# Altium integrated library Lattice CPLD ispLSI.IntLib: 471 symbols (part 3 of 26) (continued)
## ispLSI1048E-50LQI (continued)

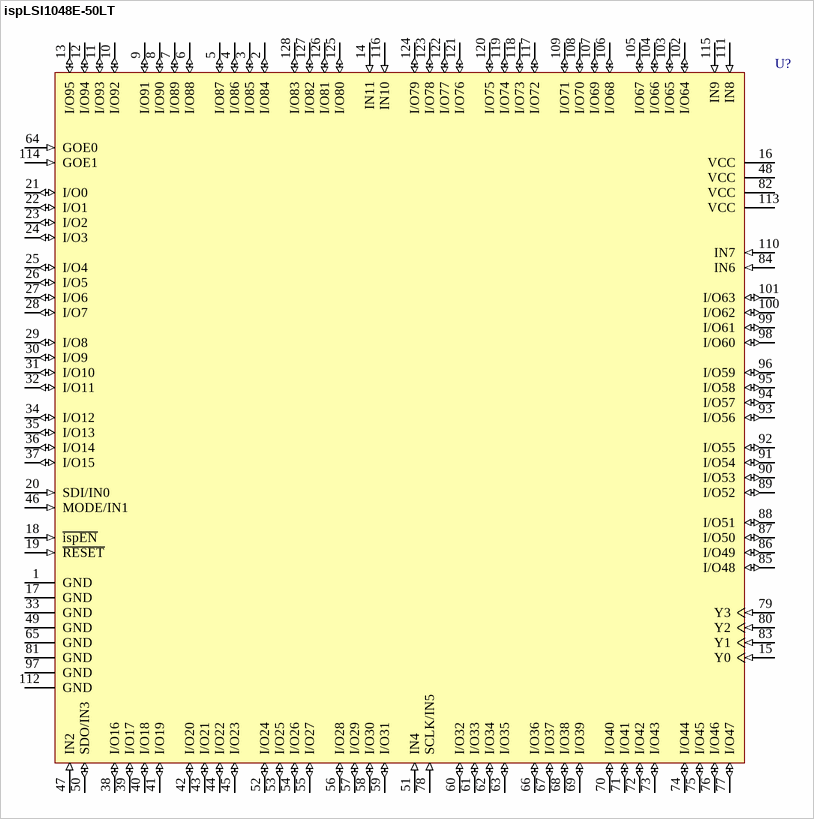
[diagram p19: symbol ispLSI1048E-50LT]

## ispLSI1048E-50LT
designator U?
In-System Programmable High-Density PLD; Note: Pins 20, 46, 50 and 78 have dual function capability.; Published: 23-Sep-2002; LatestRevisionDate: 13-Apr-2006; LatestRevisionNote: IPC-7351 Footprint Added.; DatasheetVersion: Oct-1998; PackageVersion: Aug-2005; PackageReference: TQFP128; Publisher: Altium Limited; PackageDescription: 128-Pin Thin Quad Flat Pack 0.4 mm Pitch; ComponentLink1Description: Manufacturer Link; ComponentLink1URL: http://www.latticesemi.com/products/mature/index.cfm; ComponentLink2Description: Datasheet; ComponentLink2URL: http://www.latticesemi.com/lit/docs/datasheets/cpld/1048e.pdf
footprint TQFP128_N (Thin QFP, 128-Leads, Body 14x14mm, Pitch 0.4mm, IPC Medium Density)
footprint TQFP128_L (Thin QFP, 128-Leads, Body 14x14mm, Pitch 0.4mm, IPC High Density)
footprint TQFP128_M (Thin QFP, 128-Leads, Body 14x14mm, Pitch 0.4mm, IPC Low Density)
3D model 1048E-TQFP128 (128-Pin Thin Quad Flat Pack 0.4 mm Pitch)
pins: 1 GND (power), 2 I/O84 (io), 3 I/O85 (io), 4 I/O86 (io), 5 I/O87 (io), 6 I/O88 (io), 7 I/O89 (io), 8 I/O90 (io), 9 I/O91 (io), 10 I/O92 (io), 11 I/O93 (io), 12 I/O94 (io), 13 I/O95 (io), 14 IN11 (in), 15 Y0 (in), 16 VCC (power), 17 GND (power), 18 ~{ispEN} (in), 19 ~{RESET} (in), 20 SDI/IN0 (in), 21 I/O0 (io), 22 I/O1 (io), 23 I/O2 (io), 24 I/O3 (io), 25 I/O4 (io), 26 I/O5 (io), 27 I/O6 (io), 28 I/O7 (io), 29 I/O8 (io), 30 I/O9 (io), 31 I/O10 (io), 32 I/O11 (io), 33 GND (power), 34 I/O12 (io), 35 I/O13 (io), 36 I/O14 (io), 37 I/O15 (io), 38 I/O16 (io), 39 I/O17 (io), 40 I/O18 (io), 41 I/O19 (io), 42 I/O20 (io), 43 I/O21 (io), 44 I/O22 (io), 45 I/O23 (io), 46 MODE/IN1 (in), 47 IN2 (in), 48 VCC (power), 49 GND (power), 50 SDO/IN3 (io), 51 IN4 (in), 52 I/O24 (io), 53 I/O25 (io), 54 I/O26 (io), 55 I/O27 (io), 56 I/O28 (io), 57 I/O29 (io), 58 I/O30 (io), 59 I/O31 (io), 60 I/O32 (io), 61 I/O33 (io), 62 I/O34 (io), 63 I/O35 (io), 64 GOE0 (in), 65 GND (power), 66 I/O36 (io), 67 I/O37 (io), 68 I/O38 (io), 69 I/O39 (io), 70 I/O40 (io), 71 I/O41 (io), 72 I/O42 (io), 73 I/O43 (io), 74 I/O44 (io), 75 I/O45 (io), 76 I/O46 (io), 77 I/O47 (io), 78 SCLK/IN5 (in), 79 Y3 (in), 80 Y2 (in), 81 GND (power), 82 VCC (power), 83 Y1 (in), 84 IN6 (in), 85 I/O48 (io), 86 I/O49 (io), 87 I/O50 (io), 88 I/O51 (io), 89 I/O52 (io), 90 I/O53 (io), 91 I/O54 (io), 92 I/O55 (io), 93 I/O56 (io), 94 I/O57 (io), 95 I/O58 (io), 96 I/O59 (io), 97 GND (power), 98 I/O60 (io), 99 I/O61 (io), 100 I/O62 (io), 101 I/O63 (io), 102 I/O64 (io), 103 I/O65 (io), 104 I/O66 (io), 105 I/O67 (io), 106 I/O68 (io), 107 I/O69 (io), 108 I/O70 (io), 109 I/O71 (io), 110 IN7 (in), 111 IN8 (in), 112 GND (power), 113 VCC (power), 114 GOE1 (in), 115 IN9 (in), 116 IN10 (in), 117 I/O72 (io), 118 I/O73 (io), 119 I/O74 (io), 120 I/O75 (io), 121 I/O76 (io), 122 I/O77 (io), 123 I/O78 (io), 124 I/O79 (io), 125 I/O80 (io), 126 I/O81 (io), 127 I/O82 (io), 128 I/O83 (io)

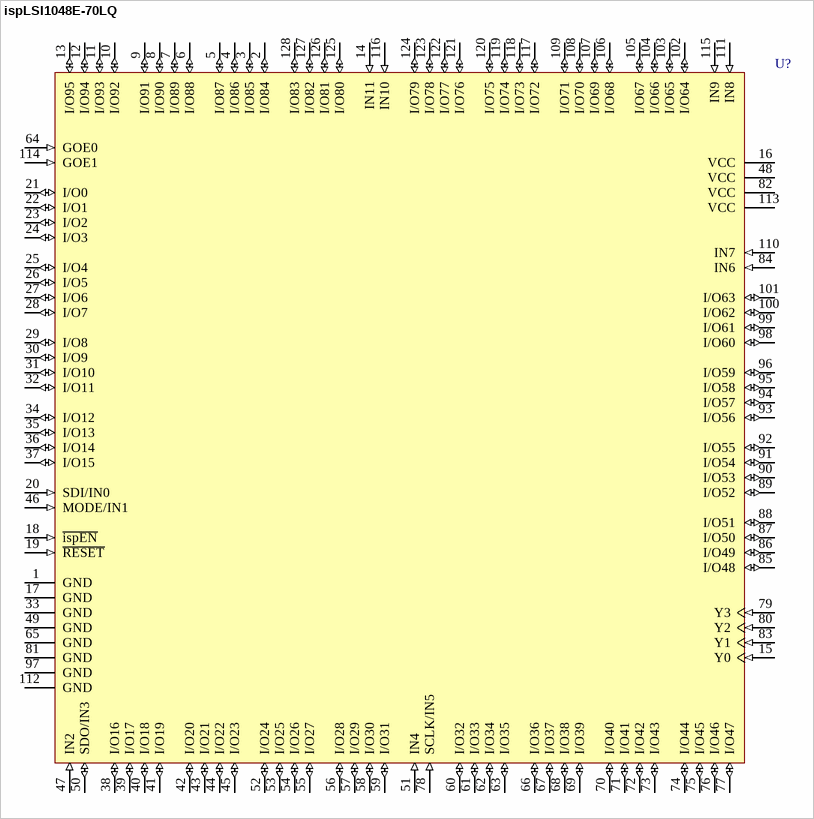
[diagram p20: symbol ispLSI1048E-70LQ]

## ispLSI1048E-70LQ
designator U?
In-System Programmable High-Density PLD; Note: Pins 20, 46, 50 and 78 have dual function capability.; Published: 23-Sep-2002; LatestRevisionDate: 13-Apr-2006; LatestRevisionNote: IPC-7351 Footprint Added.; DatasheetVersion: Oct-1998; PackageVersion: pkg_32, Aug-2005; PackageReference: PQFP128; Publisher: Altium Limited; PackageDescription: 128-Pin Quad Flat Pack 0.8 mm Pitch; Code_IPC: QFP80P3120X3120-128; ComponentLink1Description: Manufacturer Link; ComponentLink1URL: http://www.latticesemi.com/products/mature/index.cfm; ComponentLink2Description: Datasheet; ComponentLink2URL: http://www.latticesemi.com/lit/docs/datasheets/cpld/1048e.pdf
footprint PQFP128_N (QFP, 128-Leads, Body 28x28mm, Pitch 0.8mm, IPC Medium Density)
footprint PQFP128_L (QFP, 128-Leads, Body 28x28mm, Pitch 0.8mm, IPC High Density)
footprint PQFP128_M (QFP, 128-Leads, Body 28x28mm, Pitch 0.8mm, IPC Low Density)
3D model 1048E-PQFP128 (128-Pin Quad Flat Pack 0.8 mm Pitch)
pins: 1 GND (power), 2 I/O84 (io), 3 I/O85 (io), 4 I/O86 (io), 5 I/O87 (io), 6 I/O88 (io), 7 I/O89 (io), 8 I/O90 (io), 9 I/O91 (io), 10 I/O92 (io), 11 I/O93 (io), 12 I/O94 (io), 13 I/O95 (io), 14 IN11 (in), 15 Y0 (in), 16 VCC (power), 17 GND (power), 18 ~{ispEN} (in), 19 ~{RESET} (in), 20 SDI/IN0 (in), 21 I/O0 (io), 22 I/O1 (io), 23 I/O2 (io), 24 I/O3 (io), 25 I/O4 (io), 26 I/O5 (io), 27 I/O6 (io), 28 I/O7 (io), 29 I/O8 (io), 30 I/O9 (io), 31 I/O10 (io), 32 I/O11 (io), 33 GND (power), 34 I/O12 (io), 35 I/O13 (io), 36 I/O14 (io), 37 I/O15 (io), 38 I/O16 (io), 39 I/O17 (io), 40 I/O18 (io), 41 I/O19 (io), 42 I/O20 (io), 43 I/O21 (io), 44 I/O22 (io), 45 I/O23 (io), 46 MODE/IN1 (in), 47 IN2 (in), 48 VCC (power), 49 GND (power), 50 SDO/IN3 (io), 51 IN4 (in), 52 I/O24 (io), 53 I/O25 (io), 54 I/O26 (io), 55 I/O27 (io), 56 I/O28 (io), 57 I/O29 (io), 58 I/O30 (io), 59 I/O31 (io), 60 I/O32 (io), 61 I/O33 (io), 62 I/O34 (io), 63 I/O35 (io), 64 GOE0 (in), 65 GND (power), 66 I/O36 (io), 67 I/O37 (io), 68 I/O38 (io), 69 I/O39 (io), 70 I/O40 (io), 71 I/O41 (io), 72 I/O42 (io), 73 I/O43 (io), 74 I/O44 (io), 75 I/O45 (io), 76 I/O46 (io), 77 I/O47 (io), 78 SCLK/IN5 (in), 79 Y3 (in), 80 Y2 (in), 81 GND (power), 82 VCC (power), 83 Y1 (in), 84 IN6 (in), 85 I/O48 (io), 86 I/O49 (io), 87 I/O50 (io), 88 I/O51 (io), 89 I/O52 (io), 90 I/O53 (io), 91 I/O54 (io), 92 I/O55 (io), 93 I/O56 (io), 94 I/O57 (io), 95 I/O58 (io), 96 I/O59 (io), 97 GND (power), 98 I/O60 (io), 99 I/O61 (io), 100 I/O62 (io), 101 I/O63 (io), 102 I/O64 (io), 103 I/O65 (io), 104 I/O66 (io), 105 I/O67 (io), 106 I/O68 (io), 107 I/O69 (io), 108 I/O70 (io), 109 I/O71 (io), 110 IN7 (in), 111 IN8 (in), 112 GND (power), 113 VCC (power), 114 GOE1 (in), 115 IN9 (in), 116 IN10 (in), 117 I/O72 (io), 118 I/O73 (io), 119 I/O74 (io), 120 I/O75 (io), 121 I/O76 (io), 122 I/O77 (io), 123 I/O78 (io), 124 I/O79 (io), 125 I/O80 (io), 126 I/O81 (io), 127 I/O82 (io), 128 I/O83 (io)

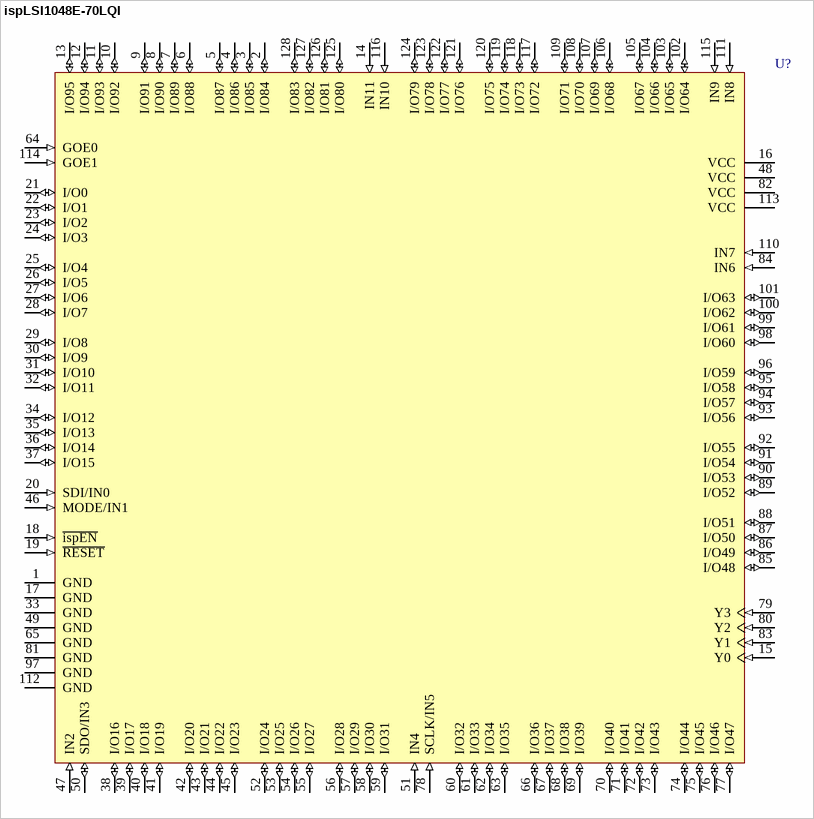
[diagram p21: symbol ispLSI1048E-70LQI]

## ispLSI1048E-70LQI
designator U?
In-System Programmable High-Density PLD; Note: Pins 20, 46, 50 and 78 have dual function capability.; Published: 23-Sep-2002; LatestRevisionDate: 13-Apr-2006; LatestRevisionNote: IPC-7351 Footprint Added.; DatasheetVersion: Oct-1998; PackageVersion: pkg_32, Aug-2005; PackageReference: PQFP128; Publisher: Altium Limited; PackageDescription: 128-Pin Quad Flat Pack 0.8 mm Pitch; Code_IPC: QFP80P3120X3120-128; ComponentLink1Description: Manufacturer Link; ComponentLink1URL: http://www.latticesemi.com/products/mature/index.cfm; ComponentLink2Description: Datasheet; ComponentLink2URL: http://www.latticesemi.com/lit/docs/datasheets/cpld/1048e.pdf
footprint PQFP128_N (QFP, 128-Leads, Body 28x28mm, Pitch 0.8mm, IPC Medium Density)
footprint PQFP128_L (QFP, 128-Leads, Body 28x28mm, Pitch 0.8mm, IPC High Density)
footprint PQFP128_M (QFP, 128-Leads, Body 28x28mm, Pitch 0.8mm, IPC Low Density)
3D model 1048E-PQFP128 (128-Pin Quad Flat Pack 0.8 mm Pitch)
pins: 1 GND (power), 2 I/O84 (io), 3 I/O85 (io), 4 I/O86 (io), 5 I/O87 (io), 6 I/O88 (io), 7 I/O89 (io), 8 I/O90 (io), 9 I/O91 (io), 10 I/O92 (io), 11 I/O93 (io), 12 I/O94 (io), 13 I/O95 (io), 14 IN11 (in), 15 Y0 (in), 16 VCC (power), 17 GND (power), 18 ~{ispEN} (in), 19 ~{RESET} (in), 20 SDI/IN0 (in), 21 I/O0 (io), 22 I/O1 (io), 23 I/O2 (io), 24 I/O3 (io), 25 I/O4 (io), 26 I/O5 (io), 27 I/O6 (io), 28 I/O7 (io), 29 I/O8 (io), 30 I/O9 (io), 31 I/O10 (io), 32 I/O11 (io), 33 GND (power), 34 I/O12 (io), 35 I/O13 (io), 36 I/O14 (io), 37 I/O15 (io), 38 I/O16 (io), 39 I/O17 (io), 40 I/O18 (io), 41 I/O19 (io), 42 I/O20 (io), 43 I/O21 (io), 44 I/O22 (io), 45 I/O23 (io), 46 MODE/IN1 (in), 47 IN2 (in), 48 VCC (power), 49 GND (power), 50 SDO/IN3 (io), 51 IN4 (in), 52 I/O24 (io), 53 I/O25 (io), 54 I/O26 (io), 55 I/O27 (io), 56 I/O28 (io), 57 I/O29 (io), 58 I/O30 (io), 59 I/O31 (io), 60 I/O32 (io), 61 I/O33 (io), 62 I/O34 (io), 63 I/O35 (io), 64 GOE0 (in), 65 GND (power), 66 I/O36 (io), 67 I/O37 (io), 68 I/O38 (io), 69 I/O39 (io), 70 I/O40 (io), 71 I/O41 (io), 72 I/O42 (io), 73 I/O43 (io), 74 I/O44 (io), 75 I/O45 (io), 76 I/O46 (io), 77 I/O47 (io), 78 SCLK/IN5 (in), 79 Y3 (in), 80 Y2 (in), 81 GND (power), 82 VCC (power), 83 Y1 (in), 84 IN6 (in), 85 I/O48 (io), 86 I/O49 (io), 87 I/O50 (io), 88 I/O51 (io), 89 I/O52 (io), 90 I/O53 (io), 91 I/O54 (io), 92 I/O55 (io), 93 I/O56 (io), 94 I/O57 (io), 95 I/O58 (io), 96 I/O59 (io), 97 GND (power), 98 I/O60 (io), 99 I/O61 (io), 100 I/O62 (io), 101 I/O63 (io), 102 I/O64 (io), 103 I/O65 (io), 104 I/O66 (io), 105 I/O67 (io), 106 I/O68 (io), 107 I/O69 (io), 108 I/O70 (io), 109 I/O71 (io), 110 IN7 (in), 111 IN8 (in), 112 GND (power), 113 VCC (power), 114 GOE1 (in), 115 IN9 (in), 116 IN10 (in), 117 I/O72 (io), 118 I/O73 (io), 119 I/O74 (io), 120 I/O75 (io), 121 I/O76 (io), 122 I/O77 (io), 123 I/O78 (io), 124 I/O79 (io), 125 I/O80 (io), 126 I/O81 (io), 127 I/O82 (io), 128 I/O83 (io)

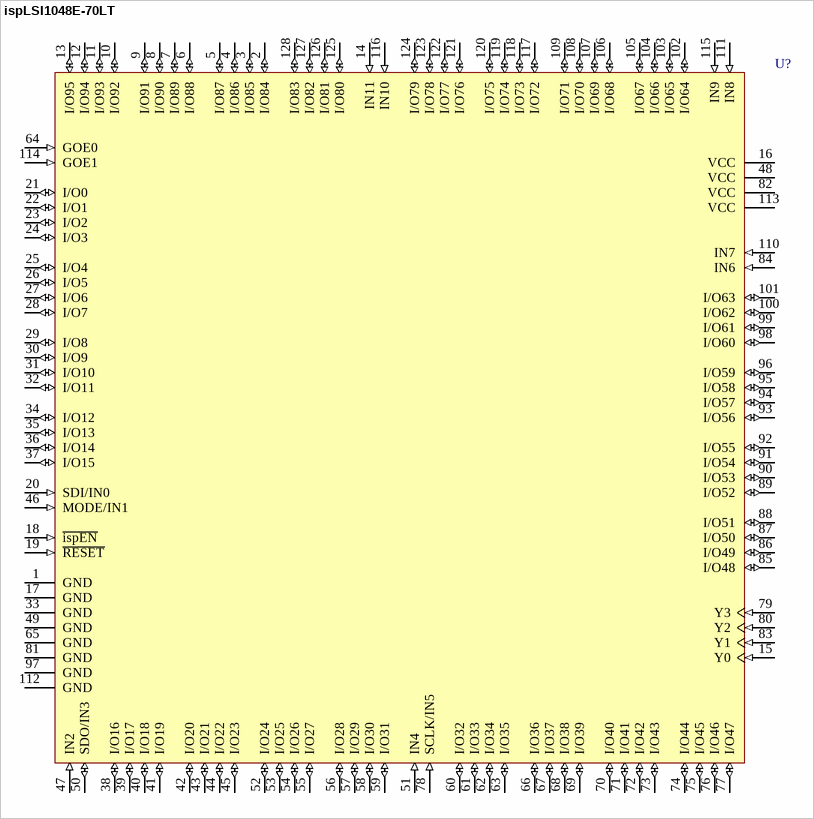
[diagram p22: symbol ispLSI1048E-70LT]

## ispLSI1048E-70LT
designator U?
In-System Programmable High-Density PLD; Note: Pins 20, 46, 50 and 78 have dual function capability.; Published: 23-Sep-2002; LatestRevisionDate: 13-Apr-2006; LatestRevisionNote: IPC-7351 Footprint Added.; DatasheetVersion: Oct-1998; PackageVersion: Aug-2005; PackageReference: TQFP128; Publisher: Altium Limited; PackageDescription: 128-Pin Thin Quad Flat Pack 0.4 mm Pitch; ComponentLink1Description: Manufacturer Link; ComponentLink1URL: http://www.latticesemi.com/products/mature/index.cfm; ComponentLink2Description: Datasheet; ComponentLink2URL: http://www.latticesemi.com/lit/docs/datasheets/cpld/1048e.pdf
footprint TQFP128_N (Thin QFP, 128-Leads, Body 14x14mm, Pitch 0.4mm, IPC Medium Density)
footprint TQFP128_L (Thin QFP, 128-Leads, Body 14x14mm, Pitch 0.4mm, IPC High Density)
footprint TQFP128_M (Thin QFP, 128-Leads, Body 14x14mm, Pitch 0.4mm, IPC Low Density)
3D model 1048E-TQFP128 (128-Pin Thin Quad Flat Pack 0.4 mm Pitch)
pins: 1 GND (power), 2 I/O84 (io), 3 I/O85 (io), 4 I/O86 (io), 5 I/O87 (io), 6 I/O88 (io), 7 I/O89 (io), 8 I/O90 (io), 9 I/O91 (io), 10 I/O92 (io), 11 I/O93 (io), 12 I/O94 (io), 13 I/O95 (io), 14 IN11 (in), 15 Y0 (in), 16 VCC (power), 17 GND (power), 18 ~{ispEN} (in), 19 ~{RESET} (in), 20 SDI/IN0 (in), 21 I/O0 (io), 22 I/O1 (io), 23 I/O2 (io), 24 I/O3 (io), 25 I/O4 (io), 26 I/O5 (io), 27 I/O6 (io), 28 I/O7 (io), 29 I/O8 (io), 30 I/O9 (io), 31 I/O10 (io), 32 I/O11 (io), 33 GND (power), 34 I/O12 (io), 35 I/O13 (io), 36 I/O14 (io), 37 I/O15 (io), 38 I/O16 (io), 39 I/O17 (io), 40 I/O18 (io), 41 I/O19 (io), 42 I/O20 (io), 43 I/O21 (io), 44 I/O22 (io), 45 I/O23 (io), 46 MODE/IN1 (in), 47 IN2 (in), 48 VCC (power), 49 GND (power), 50 SDO/IN3 (io), 51 IN4 (in), 52 I/O24 (io), 53 I/O25 (io), 54 I/O26 (io), 55 I/O27 (io), 56 I/O28 (io), 57 I/O29 (io), 58 I/O30 (io), 59 I/O31 (io), 60 I/O32 (io), 61 I/O33 (io), 62 I/O34 (io), 63 I/O35 (io), 64 GOE0 (in), 65 GND (power), 66 I/O36 (io), 67 I/O37 (io), 68 I/O38 (io), 69 I/O39 (io), 70 I/O40 (io), 71 I/O41 (io), 72 I/O42 (io), 73 I/O43 (io), 74 I/O44 (io), 75 I/O45 (io), 76 I/O46 (io), 77 I/O47 (io), 78 SCLK/IN5 (in), 79 Y3 (in), 80 Y2 (in), 81 GND (power), 82 VCC (power), 83 Y1 (in), 84 IN6 (in), 85 I/O48 (io), 86 I/O49 (io), 87 I/O50 (io), 88 I/O51 (io), 89 I/O52 (io), 90 I/O53 (io), 91 I/O54 (io), 92 I/O55 (io), 93 I/O56 (io), 94 I/O57 (io), 95 I/O58 (io), 96 I/O59 (io), 97 GND (power), 98 I/O60 (io), 99 I/O61 (io), 100 I/O62 (io), 101 I/O63 (io), 102 I/O64 (io), 103 I/O65 (io), 104 I/O66 (io), 105 I/O67 (io), 106 I/O68 (io), 107 I/O69 (io), 108 I/O70 (io), 109 I/O71 (io), 110 IN7 (in), 111 IN8 (in), 112 GND (power), 113 VCC (power), 114 GOE1 (in), 115 IN9 (in), 116 IN10 (in), 117 I/O72 (io), 118 I/O73 (io), 119 I/O74 (io), 120 I/O75 (io), 121 I/O76 (io), 122 I/O77 (io), 123 I/O78 (io), 124 I/O79 (io), 125 I/O80 (io), 126 I/O81 (io), 127 I/O82 (io), 128 I/O83 (io)

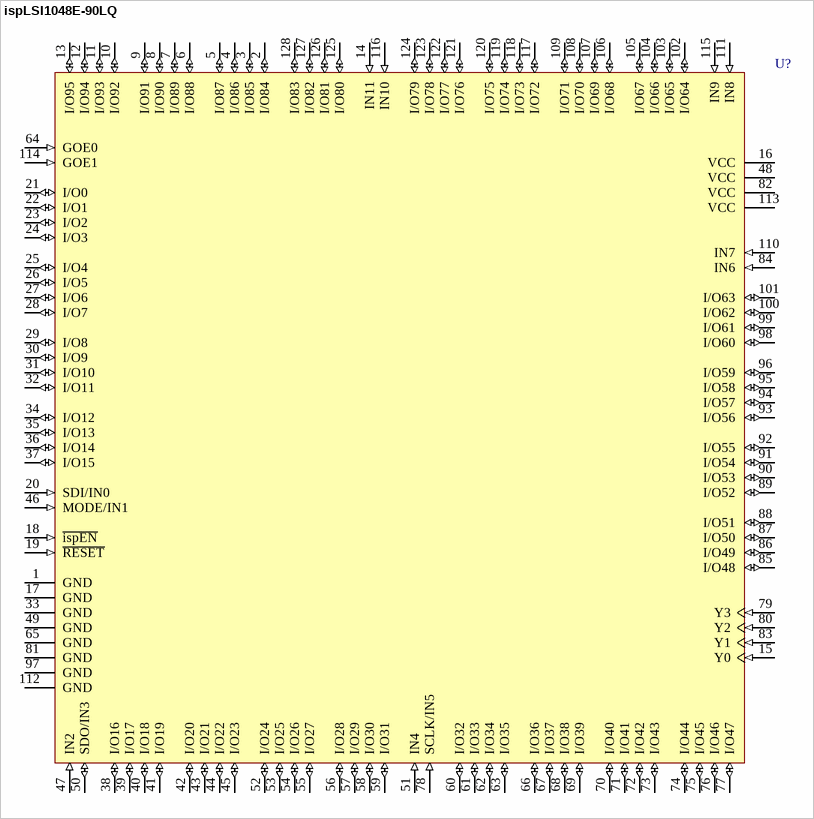
[diagram p23: symbol ispLSI1048E-90LQ]

## ispLSI1048E-90LQ
designator U?
In-System Programmable High-Density PLD; Note: Pins 20, 46, 50 and 78 have dual function capability.; Published: 23-Sep-2002; LatestRevisionDate: 13-Apr-2006; LatestRevisionNote: IPC-7351 Footprint Added.; DatasheetVersion: Oct-1998; PackageVersion: pkg_32, Aug-2005; PackageReference: PQFP128; Publisher: Altium Limited; PackageDescription: 128-Pin Quad Flat Pack 0.8 mm Pitch; Code_IPC: QFP80P3120X3120-128; ComponentLink1Description: Manufacturer Link; ComponentLink1URL: http://www.latticesemi.com/products/mature/index.cfm; ComponentLink2Description: Datasheet; ComponentLink2URL: http://www.latticesemi.com/lit/docs/datasheets/cpld/1048e.pdf
footprint PQFP128_N (QFP, 128-Leads, Body 28x28mm, Pitch 0.8mm, IPC Medium Density)
footprint PQFP128_L (QFP, 128-Leads, Body 28x28mm, Pitch 0.8mm, IPC High Density)
footprint PQFP128_M (QFP, 128-Leads, Body 28x28mm, Pitch 0.8mm, IPC Low Density)
3D model 1048E-PQFP128 (128-Pin Quad Flat Pack 0.8 mm Pitch)
pins: 1 GND (power), 2 I/O84 (io), 3 I/O85 (io), 4 I/O86 (io), 5 I/O87 (io), 6 I/O88 (io), 7 I/O89 (io), 8 I/O90 (io), 9 I/O91 (io), 10 I/O92 (io), 11 I/O93 (io), 12 I/O94 (io), 13 I/O95 (io), 14 IN11 (in), 15 Y0 (in), 16 VCC (power), 17 GND (power), 18 ~{ispEN} (in), 19 ~{RESET} (in), 20 SDI/IN0 (in), 21 I/O0 (io), 22 I/O1 (io), 23 I/O2 (io), 24 I/O3 (io), 25 I/O4 (io), 26 I/O5 (io), 27 I/O6 (io), 28 I/O7 (io), 29 I/O8 (io), 30 I/O9 (io), 31 I/O10 (io), 32 I/O11 (io), 33 GND (power), 34 I/O12 (io), 35 I/O13 (io), 36 I/O14 (io), 37 I/O15 (io), 38 I/O16 (io), 39 I/O17 (io), 40 I/O18 (io), 41 I/O19 (io), 42 I/O20 (io), 43 I/O21 (io), 44 I/O22 (io), 45 I/O23 (io), 46 MODE/IN1 (in), 47 IN2 (in), 48 VCC (power), 49 GND (power), 50 SDO/IN3 (io), 51 IN4 (in), 52 I/O24 (io), 53 I/O25 (io), 54 I/O26 (io), 55 I/O27 (io), 56 I/O28 (io), 57 I/O29 (io), 58 I/O30 (io), 59 I/O31 (io), 60 I/O32 (io), 61 I/O33 (io), 62 I/O34 (io), 63 I/O35 (io), 64 GOE0 (in), 65 GND (power), 66 I/O36 (io), 67 I/O37 (io), 68 I/O38 (io), 69 I/O39 (io), 70 I/O40 (io), 71 I/O41 (io), 72 I/O42 (io), 73 I/O43 (io), 74 I/O44 (io), 75 I/O45 (io), 76 I/O46 (io), 77 I/O47 (io), 78 SCLK/IN5 (in), 79 Y3 (in), 80 Y2 (in), 81 GND (power), 82 VCC (power), 83 Y1 (in), 84 IN6 (in), 85 I/O48 (io), 86 I/O49 (io), 87 I/O50 (io), 88 I/O51 (io), 89 I/O52 (io), 90 I/O53 (io), 91 I/O54 (io), 92 I/O55 (io), 93 I/O56 (io), 94 I/O57 (io), 95 I/O58 (io), 96 I/O59 (io), 97 GND (power), 98 I/O60 (io), 99 I/O61 (io), 100 I/O62 (io), 101 I/O63 (io), 102 I/O64 (io), 103 I/O65 (io), 104 I/O66 (io), 105 I/O67 (io), 106 I/O68 (io), 107 I/O69 (io), 108 I/O70 (io), 109 I/O71 (io), 110 IN7 (in), 111 IN8 (in), 112 GND (power), 113 VCC (power), 114 GOE1 (in), 115 IN9 (in), 116 IN10 (in), 117 I/O72 (io), 118 I/O73 (io), 119 I/O74 (io), 120 I/O75 (io), 121 I/O76 (io), 122 I/O77 (io), 123 I/O78 (io), 124 I/O79 (io), 125 I/O80 (io), 126 I/O81 (io), 127 I/O82 (io), 128 I/O83 (io)

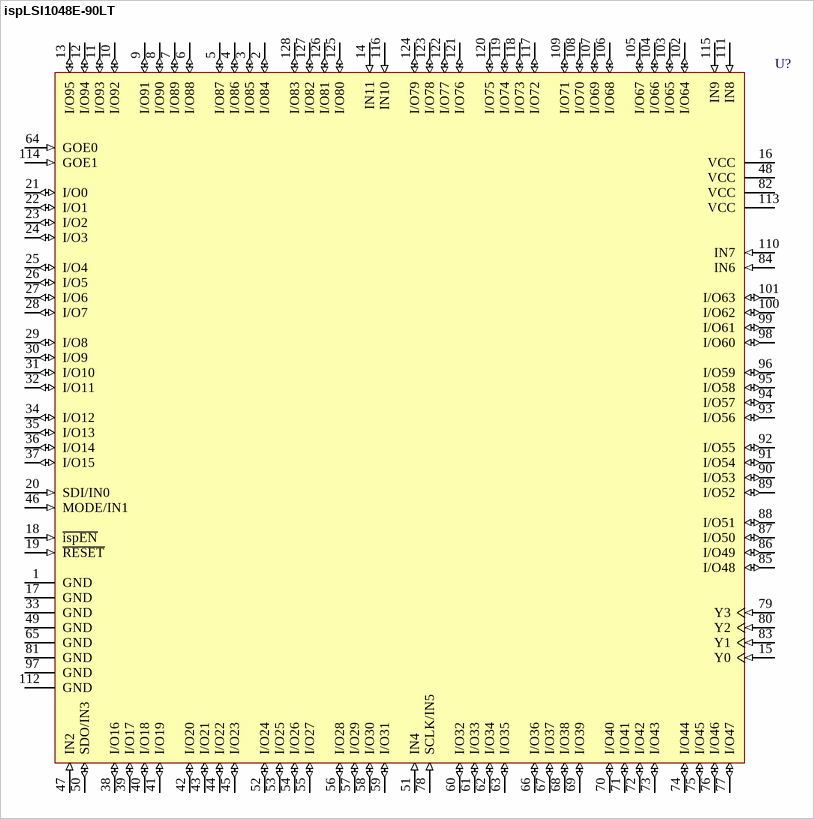
[diagram p24: symbol ispLSI1048E-90LT]

## ispLSI1048E-90LT
designator U?
In-System Programmable High-Density PLD; Note: Pins 20, 46, 50 and 78 have dual function capability.; Published: 23-Sep-2002; LatestRevisionDate: 13-Apr-2006; LatestRevisionNote: IPC-7351 Footprint Added.; DatasheetVersion: Oct-1998; PackageVersion: Aug-2005; PackageReference: TQFP128; Publisher: Altium Limited; PackageDescription: 128-Pin Thin Quad Flat Pack 0.4 mm Pitch; ComponentLink1Description: Manufacturer Link; ComponentLink1URL: http://www.latticesemi.com/products/mature/index.cfm; ComponentLink2Description: Datasheet; ComponentLink2URL: http://www.latticesemi.com/lit/docs/datasheets/cpld/1048e.pdf
footprint TQFP128_N (Thin QFP, 128-Leads, Body 14x14mm, Pitch 0.4mm, IPC Medium Density)
footprint TQFP128_L (Thin QFP, 128-Leads, Body 14x14mm, Pitch 0.4mm, IPC High Density)
footprint TQFP128_M (Thin QFP, 128-Leads, Body 14x14mm, Pitch 0.4mm, IPC Low Density)
3D model 1048E-TQFP128 (128-Pin Thin Quad Flat Pack 0.4 mm Pitch)
pins: 1 GND (power), 2 I/O84 (io), 3 I/O85 (io), 4 I/O86 (io), 5 I/O87 (io), 6 I/O88 (io), 7 I/O89 (io), 8 I/O90 (io), 9 I/O91 (io), 10 I/O92 (io), 11 I/O93 (io), 12 I/O94 (io), 13 I/O95 (io), 14 IN11 (in), 15 Y0 (in), 16 VCC (power), 17 GND (power), 18 ~{ispEN} (in), 19 ~{RESET} (in), 20 SDI/IN0 (in), 21 I/O0 (io), 22 I/O1 (io), 23 I/O2 (io), 24 I/O3 (io), 25 I/O4 (io), 26 I/O5 (io), 27 I/O6 (io), 28 I/O7 (io), 29 I/O8 (io), 30 I/O9 (io), 31 I/O10 (io), 32 I/O11 (io), 33 GND (power), 34 I/O12 (io), 35 I/O13 (io), 36 I/O14 (io), 37 I/O15 (io), 38 I/O16 (io), 39 I/O17 (io), 40 I/O18 (io), 41 I/O19 (io), 42 I/O20 (io), 43 I/O21 (io), 44 I/O22 (io), 45 I/O23 (io), 46 MODE/IN1 (in), 47 IN2 (in), 48 VCC (power), 49 GND (power), 50 SDO/IN3 (io), 51 IN4 (in), 52 I/O24 (io), 53 I/O25 (io), 54 I/O26 (io), 55 I/O27 (io), 56 I/O28 (io), 57 I/O29 (io), 58 I/O30 (io), 59 I/O31 (io), 60 I/O32 (io), 61 I/O33 (io), 62 I/O34 (io), 63 I/O35 (io), 64 GOE0 (in), 65 GND (power), 66 I/O36 (io), 67 I/O37 (io), 68 I/O38 (io), 69 I/O39 (io), 70 I/O40 (io), 71 I/O41 (io), 72 I/O42 (io), 73 I/O43 (io), 74 I/O44 (io), 75 I/O45 (io), 76 I/O46 (io), 77 I/O47 (io), 78 SCLK/IN5 (in), 79 Y3 (in), 80 Y2 (in), 81 GND (power), 82 VCC (power), 83 Y1 (in), 84 IN6 (in), 85 I/O48 (io), 86 I/O49 (io), 87 I/O50 (io), 88 I/O51 (io), 89 I/O52 (io), 90 I/O53 (io), 91 I/O54 (io), 92 I/O55 (io), 93 I/O56 (io), 94 I/O57 (io), 95 I/O58 (io), 96 I/O59 (io), 97 GND (power), 98 I/O60 (io), 99 I/O61 (io), 100 I/O62 (io), 101 I/O63 (io), 102 I/O64 (io), 103 I/O65 (io), 104 I/O66 (io), 105 I/O67 (io), 106 I/O68 (io), 107 I/O69 (io), 108 I/O70 (io), 109 I/O71 (io), 110 IN7 (in), 111 IN8 (in), 112 GND (power), 113 VCC (power), 114 GOE1 (in), 115 IN9 (in), 116 IN10 (in), 117 I/O72 (io), 118 I/O73 (io), 119 I/O74 (io), 120 I/O75 (io), 121 I/O76 (io), 122 I/O77 (io), 123 I/O78 (io), 124 I/O79 (io), 125 I/O80 (io), 126 I/O81 (io), 127 I/O82 (io), 128 I/O83 (io)

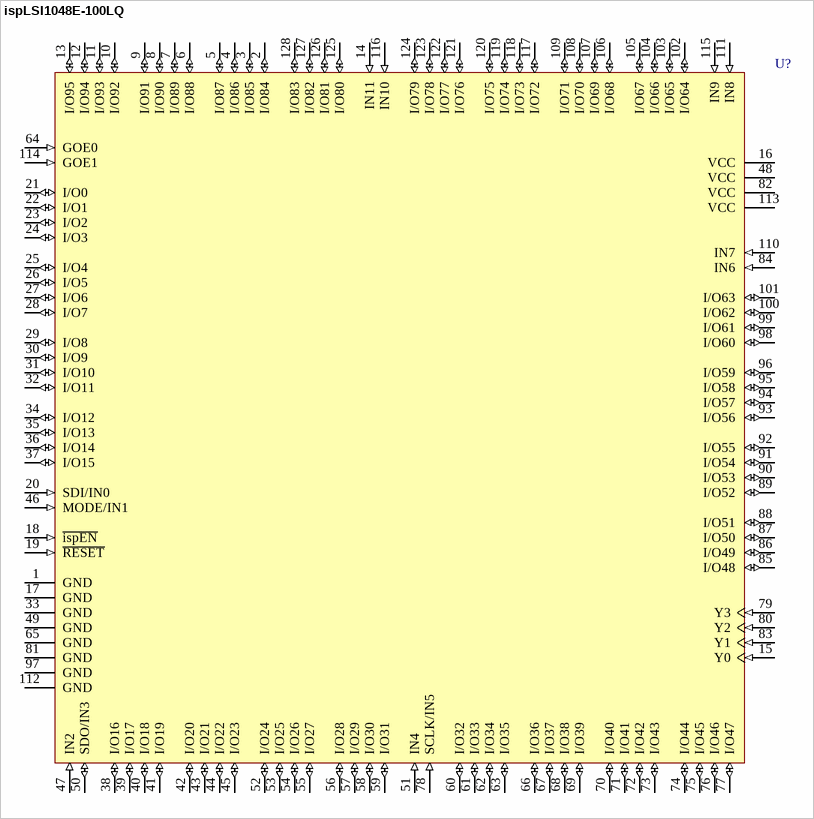
[diagram p25: symbol ispLSI1048E-100LQ]

## ispLSI1048E-100LQ
designator U?
In-System Programmable High-Density PLD; Note: Pins 20, 46, 50 and 78 have dual function capability.; Published: 23-Sep-2002; LatestRevisionDate: 13-Apr-2006; LatestRevisionNote: IPC-7351 Footprint Added.; DatasheetVersion: Oct-1998; PackageVersion: pkg_32, Aug-2005; PackageReference: PQFP128; Publisher: Altium Limited; PackageDescription: 128-Pin Quad Flat Pack 0.8 mm Pitch; Code_IPC: QFP80P3120X3120-128; ComponentLink1Description: Manufacturer Link; ComponentLink1URL: http://www.latticesemi.com/products/mature/index.cfm; ComponentLink2Description: Datasheet; ComponentLink2URL: http://www.latticesemi.com/lit/docs/datasheets/cpld/1048e.pdf
footprint PQFP128_N (QFP, 128-Leads, Body 28x28mm, Pitch 0.8mm, IPC Medium Density)
footprint PQFP128_L (QFP, 128-Leads, Body 28x28mm, Pitch 0.8mm, IPC High Density)
footprint PQFP128_M (QFP, 128-Leads, Body 28x28mm, Pitch 0.8mm, IPC Low Density)
3D model 1048E-PQFP128 (128-Pin Quad Flat Pack 0.8 mm Pitch)
pins: 1 GND (power), 2 I/O84 (io), 3 I/O85 (io), 4 I/O86 (io), 5 I/O87 (io), 6 I/O88 (io), 7 I/O89 (io), 8 I/O90 (io), 9 I/O91 (io), 10 I/O92 (io), 11 I/O93 (io), 12 I/O94 (io), 13 I/O95 (io), 14 IN11 (in), 15 Y0 (in), 16 VCC (power), 17 GND (power), 18 ~{ispEN} (in), 19 ~{RESET} (in), 20 SDI/IN0 (in), 21 I/O0 (io), 22 I/O1 (io), 23 I/O2 (io), 24 I/O3 (io), 25 I/O4 (io), 26 I/O5 (io), 27 I/O6 (io), 28 I/O7 (io), 29 I/O8 (io), 30 I/O9 (io), 31 I/O10 (io), 32 I/O11 (io), 33 GND (power), 34 I/O12 (io), 35 I/O13 (io), 36 I/O14 (io), 37 I/O15 (io), 38 I/O16 (io), 39 I/O17 (io), 40 I/O18 (io), 41 I/O19 (io), 42 I/O20 (io), 43 I/O21 (io), 44 I/O22 (io), 45 I/O23 (io), 46 MODE/IN1 (in), 47 IN2 (in), 48 VCC (power), 49 GND (power), 50 SDO/IN3 (io), 51 IN4 (in), 52 I/O24 (io), 53 I/O25 (io), 54 I/O26 (io), 55 I/O27 (io), 56 I/O28 (io), 57 I/O29 (io), 58 I/O30 (io), 59 I/O31 (io), 60 I/O32 (io), 61 I/O33 (io), 62 I/O34 (io), 63 I/O35 (io), 64 GOE0 (in), 65 GND (power), 66 I/O36 (io), 67 I/O37 (io), 68 I/O38 (io), 69 I/O39 (io), 70 I/O40 (io), 71 I/O41 (io), 72 I/O42 (io), 73 I/O43 (io), 74 I/O44 (io), 75 I/O45 (io), 76 I/O46 (io), 77 I/O47 (io), 78 SCLK/IN5 (in), 79 Y3 (in), 80 Y2 (in), 81 GND (power), 82 VCC (power), 83 Y1 (in), 84 IN6 (in), 85 I/O48 (io), 86 I/O49 (io), 87 I/O50 (io), 88 I/O51 (io), 89 I/O52 (io), 90 I/O53 (io), 91 I/O54 (io), 92 I/O55 (io), 93 I/O56 (io), 94 I/O57 (io), 95 I/O58 (io), 96 I/O59 (io), 97 GND (power), 98 I/O60 (io), 99 I/O61 (io), 100 I/O62 (io), 101 I/O63 (io), 102 I/O64 (io), 103 I/O65 (io), 104 I/O66 (io), 105 I/O67 (io), 106 I/O68 (io), 107 I/O69 (io), 108 I/O70 (io), 109 I/O71 (io), 110 IN7 (in), 111 IN8 (in), 112 GND (power), 113 VCC (power), 114 GOE1 (in), 115 IN9 (in), 116 IN10 (in), 117 I/O72 (io), 118 I/O73 (io), 119 I/O74 (io), 120 I/O75 (io), 121 I/O76 (io), 122 I/O77 (io), 123 I/O78 (io), 124 I/O79 (io), 125 I/O80 (io), 126 I/O81 (io), 127 I/O82 (io), 128 I/O83 (io)

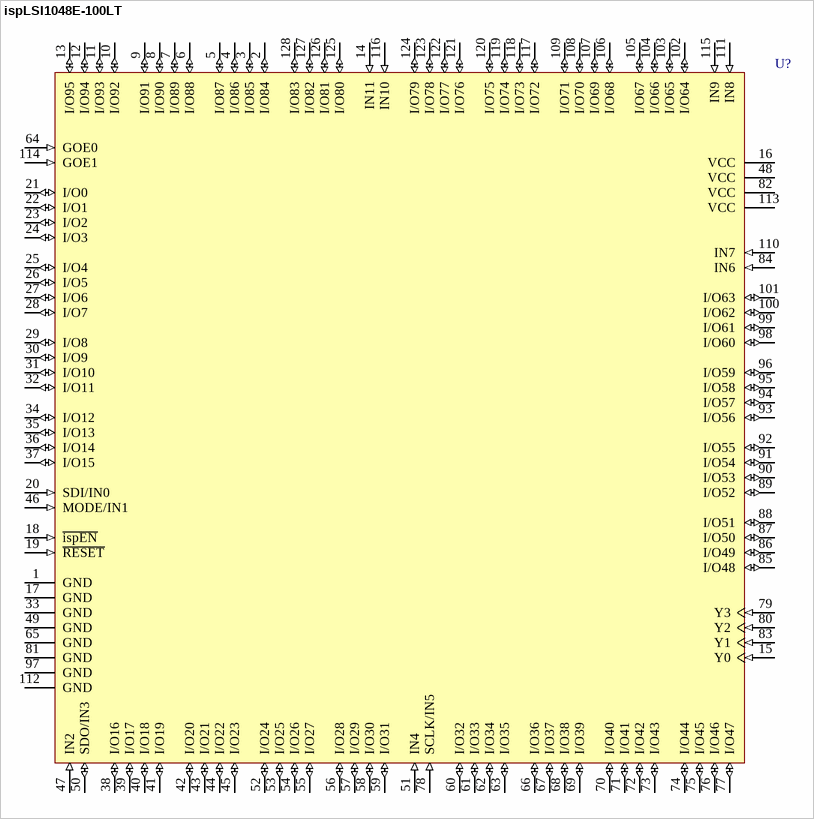
[diagram p26: symbol ispLSI1048E-100LT]

## ispLSI1048E-100LT
designator U?
In-System Programmable High-Density PLD; Note: Pins 20, 46, 50 and 78 have dual function capability.; Published: 23-Sep-2002; LatestRevisionDate: 13-Apr-2006; LatestRevisionNote: IPC-7351 Footprint Added.; DatasheetVersion: Oct-1998; PackageVersion: Aug-2005; PackageReference: TQFP128; Publisher: Altium Limited; PackageDescription: 128-Pin Thin Quad Flat Pack 0.4 mm Pitch; ComponentLink1Description: Manufacturer Link; ComponentLink1URL: http://www.latticesemi.com/products/mature/index.cfm; ComponentLink2Description: Datasheet; ComponentLink2URL: http://www.latticesemi.com/lit/docs/datasheets/cpld/1048e.pdf
footprint TQFP128_N (Thin QFP, 128-Leads, Body 14x14mm, Pitch 0.4mm, IPC Medium Density)
footprint TQFP128_L (Thin QFP, 128-Leads, Body 14x14mm, Pitch 0.4mm, IPC High Density)
footprint TQFP128_M (Thin QFP, 128-Leads, Body 14x14mm, Pitch 0.4mm, IPC Low Density)
3D model 1048E-TQFP128 (128-Pin Thin Quad Flat Pack 0.4 mm Pitch)
pins: 1 GND (power), 2 I/O84 (io), 3 I/O85 (io), 4 I/O86 (io), 5 I/O87 (io), 6 I/O88 (io), 7 I/O89 (io), 8 I/O90 (io), 9 I/O91 (io), 10 I/O92 (io), 11 I/O93 (io), 12 I/O94 (io), 13 I/O95 (io), 14 IN11 (in), 15 Y0 (in), 16 VCC (power), 17 GND (power), 18 ~{ispEN} (in), 19 ~{RESET} (in), 20 SDI/IN0 (in), 21 I/O0 (io), 22 I/O1 (io), 23 I/O2 (io), 24 I/O3 (io), 25 I/O4 (io), 26 I/O5 (io), 27 I/O6 (io), 28 I/O7 (io), 29 I/O8 (io), 30 I/O9 (io), 31 I/O10 (io), 32 I/O11 (io), 33 GND (power), 34 I/O12 (io), 35 I/O13 (io), 36 I/O14 (io), 37 I/O15 (io), 38 I/O16 (io), 39 I/O17 (io), 40 I/O18 (io), 41 I/O19 (io), 42 I/O20 (io), 43 I/O21 (io), 44 I/O22 (io), 45 I/O23 (io), 46 MODE/IN1 (in), 47 IN2 (in), 48 VCC (power), 49 GND (power), 50 SDO/IN3 (io), 51 IN4 (in), 52 I/O24 (io), 53 I/O25 (io), 54 I/O26 (io), 55 I/O27 (io), 56 I/O28 (io), 57 I/O29 (io), 58 I/O30 (io), 59 I/O31 (io), 60 I/O32 (io), 61 I/O33 (io), 62 I/O34 (io), 63 I/O35 (io), 64 GOE0 (in), 65 GND (power), 66 I/O36 (io), 67 I/O37 (io), 68 I/O38 (io), 69 I/O39 (io), 70 I/O40 (io), 71 I/O41 (io), 72 I/O42 (io), 73 I/O43 (io), 74 I/O44 (io), 75 I/O45 (io), 76 I/O46 (io), 77 I/O47 (io), 78 SCLK/IN5 (in), 79 Y3 (in), 80 Y2 (in), 81 GND (power), 82 VCC (power), 83 Y1 (in), 84 IN6 (in), 85 I/O48 (io), 86 I/O49 (io), 87 I/O50 (io), 88 I/O51 (io), 89 I/O52 (io), 90 I/O53 (io), 91 I/O54 (io), 92 I/O55 (io), 93 I/O56 (io), 94 I/O57 (io), 95 I/O58 (io), 96 I/O59 (io), 97 GND (power), 98 I/O60 (io), 99 I/O61 (io), 100 I/O62 (io), 101 I/O63 (io), 102 I/O64 (io), 103 I/O65 (io), 104 I/O66 (io), 105 I/O67 (io), 106 I/O68 (io), 107 I/O69 (io), 108 I/O70 (io), 109 I/O71 (io), 110 IN7 (in), 111 IN8 (in), 112 GND (power), 113 VCC (power), 114 GOE1 (in), 115 IN9 (in), 116 IN10 (in), 117 I/O72 (io), 118 I/O73 (io), 119 I/O74 (io), 120 I/O75 (io), 121 I/O76 (io), 122 I/O77 (io), 123 I/O78 (io), 124 I/O79 (io), 125 I/O80 (io), 126 I/O81 (io), 127 I/O82 (io), 128 I/O83 (io)

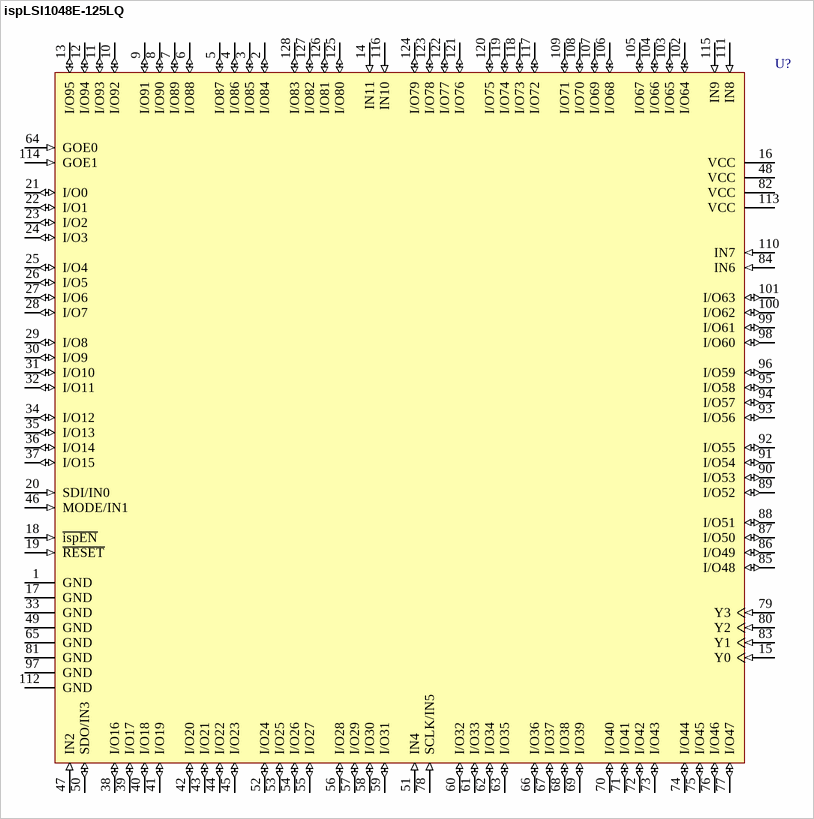
[diagram p27: symbol ispLSI1048E-125LQ]

## ispLSI1048E-125LQ
designator U?
In-System Programmable High-Density PLD; Note: Pins 20, 46, 50 and 78 have dual function capability.; Published: 23-Sep-2002; LatestRevisionDate: 13-Apr-2006; LatestRevisionNote: IPC-7351 Footprint Added.; DatasheetVersion: Oct-1998; PackageVersion: pkg_32, Aug-2005; PackageReference: PQFP128; Publisher: Altium Limited; PackageDescription: 128-Pin Quad Flat Pack 0.8 mm Pitch; Code_IPC: QFP80P3120X3120-128; ComponentLink1Description: Manufacturer Link; ComponentLink1URL: http://www.latticesemi.com/products/mature/index.cfm; ComponentLink2Description: Datasheet; ComponentLink2URL: http://www.latticesemi.com/lit/docs/datasheets/cpld/1048e.pdf
footprint PQFP128_N (QFP, 128-Leads, Body 28x28mm, Pitch 0.8mm, IPC Medium Density)
footprint PQFP128_L (QFP, 128-Leads, Body 28x28mm, Pitch 0.8mm, IPC High Density)
footprint PQFP128_M (QFP, 128-Leads, Body 28x28mm, Pitch 0.8mm, IPC Low Density)
3D model 1048E-PQFP128 (128-Pin Quad Flat Pack 0.8 mm Pitch)
pins: 1 GND (power), 2 I/O84 (io), 3 I/O85 (io), 4 I/O86 (io), 5 I/O87 (io), 6 I/O88 (io), 7 I/O89 (io), 8 I/O90 (io), 9 I/O91 (io), 10 I/O92 (io), 11 I/O93 (io), 12 I/O94 (io), 13 I/O95 (io), 14 IN11 (in), 15 Y0 (in), 16 VCC (power), 17 GND (power), 18 ~{ispEN} (in), 19 ~{RESET} (in), 20 SDI/IN0 (in), 21 I/O0 (io), 22 I/O1 (io), 23 I/O2 (io), 24 I/O3 (io), 25 I/O4 (io), 26 I/O5 (io), 27 I/O6 (io), 28 I/O7 (io), 29 I/O8 (io), 30 I/O9 (io), 31 I/O10 (io), 32 I/O11 (io), 33 GND (power), 34 I/O12 (io), 35 I/O13 (io), 36 I/O14 (io), 37 I/O15 (io), 38 I/O16 (io), 39 I/O17 (io), 40 I/O18 (io), 41 I/O19 (io), 42 I/O20 (io), 43 I/O21 (io), 44 I/O22 (io), 45 I/O23 (io), 46 MODE/IN1 (in), 47 IN2 (in), 48 VCC (power), 49 GND (power), 50 SDO/IN3 (io), 51 IN4 (in), 52 I/O24 (io), 53 I/O25 (io), 54 I/O26 (io), 55 I/O27 (io), 56 I/O28 (io), 57 I/O29 (io), 58 I/O30 (io), 59 I/O31 (io), 60 I/O32 (io), 61 I/O33 (io), 62 I/O34 (io), 63 I/O35 (io), 64 GOE0 (in), 65 GND (power), 66 I/O36 (io), 67 I/O37 (io), 68 I/O38 (io), 69 I/O39 (io), 70 I/O40 (io), 71 I/O41 (io), 72 I/O42 (io), 73 I/O43 (io), 74 I/O44 (io), 75 I/O45 (io), 76 I/O46 (io), 77 I/O47 (io), 78 SCLK/IN5 (in), 79 Y3 (in), 80 Y2 (in), 81 GND (power), 82 VCC (power), 83 Y1 (in), 84 IN6 (in), 85 I/O48 (io), 86 I/O49 (io), 87 I/O50 (io), 88 I/O51 (io), 89 I/O52 (io), 90 I/O53 (io), 91 I/O54 (io), 92 I/O55 (io), 93 I/O56 (io), 94 I/O57 (io), 95 I/O58 (io), 96 I/O59 (io), 97 GND (power), 98 I/O60 (io), 99 I/O61 (io), 100 I/O62 (io), 101 I/O63 (io), 102 I/O64 (io), 103 I/O65 (io), 104 I/O66 (io), 105 I/O67 (io), 106 I/O68 (io), 107 I/O69 (io), 108 I/O70 (io), 109 I/O71 (io), 110 IN7 (in), 111 IN8 (in), 112 GND (power), 113 VCC (power), 114 GOE1 (in), 115 IN9 (in), 116 IN10 (in), 117 I/O72 (io), 118 I/O73 (io), 119 I/O74 (io), 120 I/O75 (io), 121 I/O76 (io), 122 I/O77 (io), 123 I/O78 (io), 124 I/O79 (io), 125 I/O80 (io), 126 I/O81 (io), 127 I/O82 (io), 128 I/O83 (io)

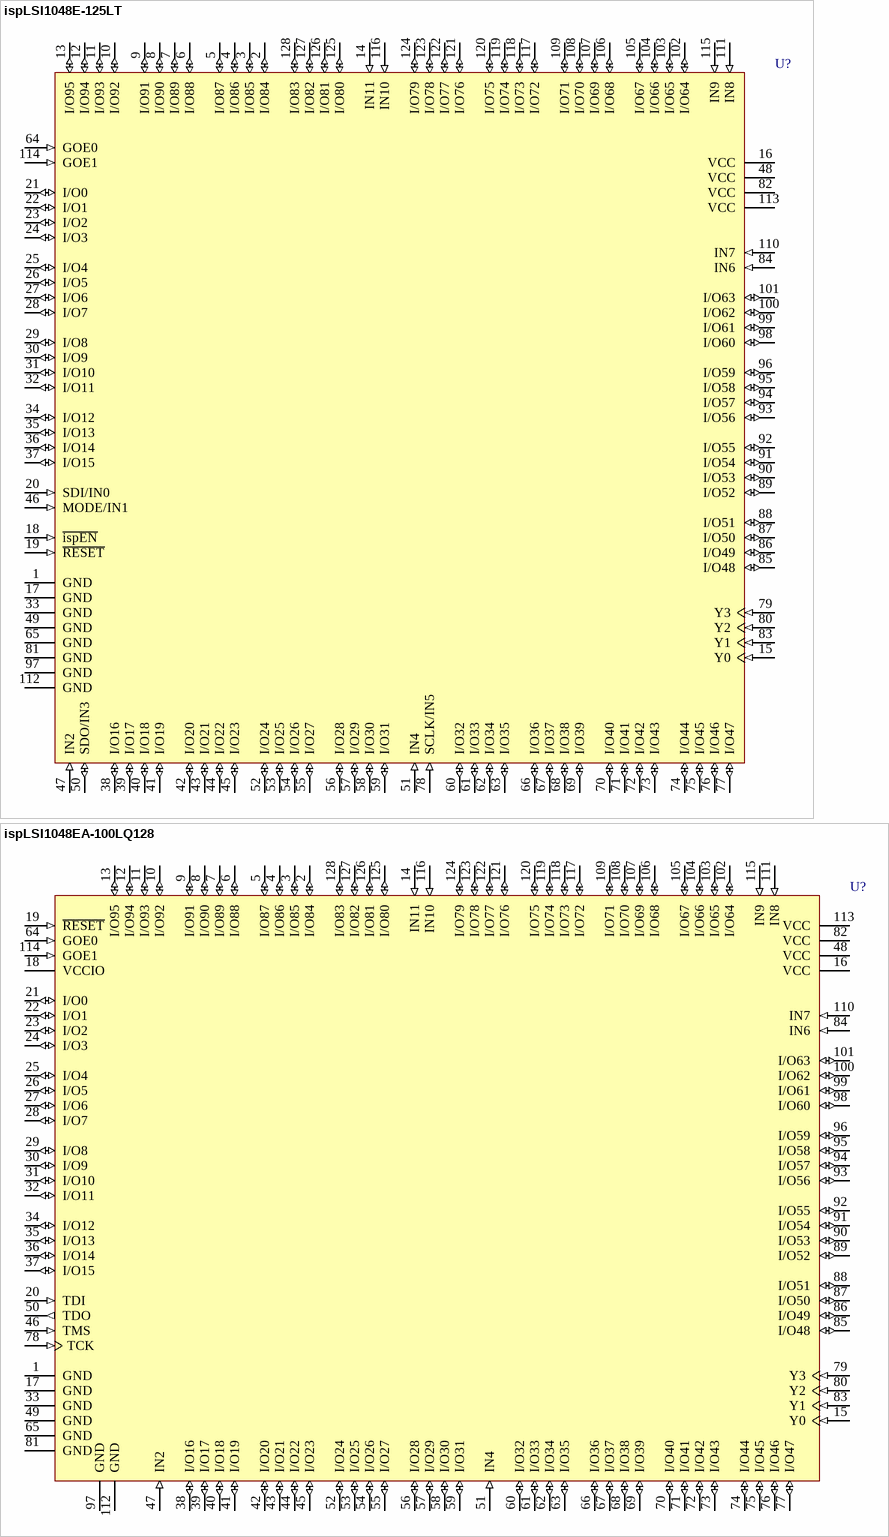
[diagram p28: symbols ispLSI1048E-125LT to ispLSI1048EA-100LQ128]

## ispLSI1048E-125LT
designator U?
In-System Programmable High-Density PLD; Note: Pins 20, 46, 50 and 78 have dual function capability.; Published: 23-Sep-2002; LatestRevisionDate: 13-Apr-2006; LatestRevisionNote: IPC-7351 Footprint Added.; DatasheetVersion: Oct-1998; PackageVersion: Aug-2005; PackageReference: TQFP128; Publisher: Altium Limited; PackageDescription: 128-Pin Thin Quad Flat Pack 0.4 mm Pitch; ComponentLink1Description: Manufacturer Link; ComponentLink1URL: http://www.latticesemi.com/products/mature/index.cfm; ComponentLink2Description: Datasheet; ComponentLink2URL: http://www.latticesemi.com/lit/docs/datasheets/cpld/1048e.pdf
footprint TQFP128_N (Thin QFP, 128-Leads, Body 14x14mm, Pitch 0.4mm, IPC Medium Density)
footprint TQFP128_L (Thin QFP, 128-Leads, Body 14x14mm, Pitch 0.4mm, IPC High Density)
footprint TQFP128_M (Thin QFP, 128-Leads, Body 14x14mm, Pitch 0.4mm, IPC Low Density)
3D model 1048E-TQFP128 (128-Pin Thin Quad Flat Pack 0.4 mm Pitch)
pins: 1 GND (power), 2 I/O84 (io), 3 I/O85 (io), 4 I/O86 (io), 5 I/O87 (io), 6 I/O88 (io), 7 I/O89 (io), 8 I/O90 (io), 9 I/O91 (io), 10 I/O92 (io), 11 I/O93 (io), 12 I/O94 (io), 13 I/O95 (io), 14 IN11 (in), 15 Y0 (in), 16 VCC (power), 17 GND (power), 18 ~{ispEN} (in), 19 ~{RESET} (in), 20 SDI/IN0 (in), 21 I/O0 (io), 22 I/O1 (io), 23 I/O2 (io), 24 I/O3 (io), 25 I/O4 (io), 26 I/O5 (io), 27 I/O6 (io), 28 I/O7 (io), 29 I/O8 (io), 30 I/O9 (io), 31 I/O10 (io), 32 I/O11 (io), 33 GND (power), 34 I/O12 (io), 35 I/O13 (io), 36 I/O14 (io), 37 I/O15 (io), 38 I/O16 (io), 39 I/O17 (io), 40 I/O18 (io), 41 I/O19 (io), 42 I/O20 (io), 43 I/O21 (io), 44 I/O22 (io), 45 I/O23 (io), 46 MODE/IN1 (in), 47 IN2 (in), 48 VCC (power), 49 GND (power), 50 SDO/IN3 (io), 51 IN4 (in), 52 I/O24 (io), 53 I/O25 (io), 54 I/O26 (io), 55 I/O27 (io), 56 I/O28 (io), 57 I/O29 (io), 58 I/O30 (io), 59 I/O31 (io), 60 I/O32 (io), 61 I/O33 (io), 62 I/O34 (io), 63 I/O35 (io), 64 GOE0 (in), 65 GND (power), 66 I/O36 (io), 67 I/O37 (io), 68 I/O38 (io), 69 I/O39 (io), 70 I/O40 (io), 71 I/O41 (io), 72 I/O42 (io), 73 I/O43 (io), 74 I/O44 (io), 75 I/O45 (io), 76 I/O46 (io), 77 I/O47 (io), 78 SCLK/IN5 (in), 79 Y3 (in), 80 Y2 (in), 81 GND (power), 82 VCC (power), 83 Y1 (in), 84 IN6 (in), 85 I/O48 (io), 86 I/O49 (io), 87 I/O50 (io), 88 I/O51 (io), 89 I/O52 (io), 90 I/O53 (io), 91 I/O54 (io), 92 I/O55 (io), 93 I/O56 (io), 94 I/O57 (io), 95 I/O58 (io), 96 I/O59 (io), 97 GND (power), 98 I/O60 (io), 99 I/O61 (io), 100 I/O62 (io), 101 I/O63 (io), 102 I/O64 (io), 103 I/O65 (io), 104 I/O66 (io), 105 I/O67 (io), 106 I/O68 (io), 107 I/O69 (io), 108 I/O70 (io), 109 I/O71 (io), 110 IN7 (in), 111 IN8 (in), 112 GND (power), 113 VCC (power), 114 GOE1 (in), 115 IN9 (in), 116 IN10 (in), 117 I/O72 (io), 118 I/O73 (io), 119 I/O74 (io), 120 I/O75 (io), 121 I/O76 (io), 122 I/O77 (io), 123 I/O78 (io), 124 I/O79 (io), 125 I/O80 (io), 126 I/O81 (io), 127 I/O82 (io), 128 I/O83 (io)